# Altium schematic symbol library LATTICEPLDS_Library.SchLib: 291 symbols (part 16 of 32) (continued)
## LFE3-95EA-FN1156 (continued)
part B pins: A2 PT8B, A3 PT11B, A4 PT14A, A5 PT14B, A6 PT17B, A7 PT16B, A8 PT19A, A9 PT19B, A10 PT20A, A11 PT26A, A12 PT32A, A13 PT41A, A14 PT56A, A15 PT62A, A16 PT68A, B1 PT5A, B2 PT5B, B3 PT8A, B4 PT11A, B6 PT17A, B7 PT16A, B10 PT20B, B11 PT26B, B12 PT32B, B13 PT41B, B14 PT56B, B15 PT62B, B16 PT68B, C2 PT4B, C3 PT2A, C4 PT2B, C5 PT13B, C6 PT10B, C10 PT43B, C11 PT23A, C13 PT44A, C14 PT50A, C16 PT65A, C17 PT71A, D3 PT4A, D4 PT7B, D5 PT10A, D6 PT13A, D10 PT43A, D11 PT23B, D12 PT35A, D13 PT44B, D14 PT50B, D15 PT59A, D16 PT65B, D17 PT71B, E4 PT7A, E10 PT31B, E11 PT29A, E12 PT35B, E13 PT38A, E15 PT59B, E17 PT64A, F10 PT31A, F12 PT29B, F13 PT38B, F18 PT64B, F19 PT70B, G11 PT25A, G12 PT25B, G13 PT40A, G16 PT58A, G17 PT58B, G18 PT70A, H13 PT34B, H14 PT40B, H15 PT46B, H16 PT61B, H17 PT73B, J12 PT22A, J13 PT28B, J14 PT34A, J15 PT46A, J16 PT61A, J17 PT73A, K12 PT22B, K13 PT28A, K14 PT37A, K15 PT37B, K16 PT67A, L13 VCCIO0 (power), L16 PT67B, L17 VCCIO0 (power), M13 VCCIO0 (power), M17 VCCIO0 (power)
part C pins: A17 PT74A, A18 PT77A, A19 PT83A, A20 PT89A, A21 PT98A, A22 PT104A, A23 PT110A, A24 PT116A, A25 PT122A, A26 PT130A, A27 PT130B, A28 PT128B, A29 PT131A, A30 PT131B, A31 PT134A, B17 PT74B, B18 PT77B, B19 PT83B, B20 PT89B, B21 PT98B, B22 PT104B, B23 PT110B, B24 PT116B, B25 PT122B, B28 PT128A, B31 PT134B, C19 PT86A, C20 PT95A, C22 PT107A, C23 PT113A, C25 PT125A, C28 PT124A, C29 PT136A, C30 PT136B, D18 PT80A, D19 PT86B, D20 PT95B, D21 PT101A, D22 PT107B, D23 PT113B, D24 PT119A, D25 PT125B, D28 PT124B, E18 PT80B, E19 PT76A, E20 PT76B, E21 PT101B, E22 PT112A, E23 PT112B, E24 PT119B, F21 PT97A, F22 PT97B, G19 PT82A, G20 PT91A, G21 PT91B, G23 PT118A, G25 PT127B, G26 PT127A, H18 PT79B, H19 PT82B, H20 PT103A, H22 PT109B, H23 PT118B, H25 PT133B, H26 PT133A, J18 PT79A, J19 PT88A, J20 PT103B, J21 PT109A, J22 PT106A, J23 PT106B, K19 PT88B, K20 PT85A, K21 PT115B, K22 PT115A, K23 PT121A, K24 PT121B, L18 VCCIO1 (power), L19 PT85B, L22 VCCIO1 (power), M18 VCCIO1 (power), M22 VCCIO1 (power)
part D pins: N23 VCCIO2 (power), N24 VCCIO2 (power), N26 PR19A, N27 PR22A, N28 PR22B, N29 PR17B, N30 PR17A, N31 PR20B, N32 PR20A, N33 PR23B, N34 PR23A, P26 PR19B, P27 PR25B, P28 PR25A, P30 PR25E_C, P31 PR25E_B, P32 PR25E_A, P33 PR26B, P34 PR26A, R25 PR31B, R26 PR31A, R27 PR28B, R28 PR28A, R29 PR25E_D, R30 PR29B, R31 PR29A, R33 PR32B, R34 PR32A, T26 PR37A, T27 PR37B, T28 PR34B, T29 PR34A, T30 PR40A, T31 PR35B, T32 PR35A, T33 PR38B, T34 PR38A, U23 VCCIO2 (power), U24 VCCIO2 (power), U26 PR43A, U27 PR43B, U30 PR40B, U31 PR41B, U32 PR41A, U33 PR43E_B, U34 PR43E_A, V33 PR43E_D, V34 PR43E_C
part E pins: AA25 PR64A, AA26 PR64B, AA27 PR70B, AA28 PR70A, AA29 PR58B, AA30 PR65B, AA31 PR65A, AA33 PR61E_B, AA34 PR61E_A, AB23 VCCIO3 (power), AB24 VCCIO3 (power), AB28 PR70E_C, AB29 PR70E_D, AB30 PR67A, AB33 PR62B, AB34 PR62A, AC30 PR67B, AC31 PR70E_B, AC32 PR70E_A, AC33 PR68B, AC34 PR68A, AE26 PB145B, AE29 PR74B, AE30 PR74A, AE31 PR71B, AE32 PR71A, AF26 PB145A, AF31 PR77B, AF32 PR77A, AG26 PB136B, AH26 PB136A, AH27 PB142A, AH28 PB142B, AH33 PR82A, AJ27 PB139B, AJ28 PB140B, AJ31 PR88A, AJ33 PR82B, AJ34 PR79E_C, AK27 PB139A, AK28 PB140A, AK29 PB143B, AK31 PR88B, AK32 PR86B, AK34 PR79E_D, AL27 PB134B, AL28 PB137B, AL29 PB143A, AL30 PR91A, AL31 PR95A, AL32 PR86A, AL33 PR85B, AL34 PR85A, AM27 PB134A, AM28 PB137A, AM29 PR97A, AM30 PR91B, AM31 PR95B, AM32 PR89B, AM33 PR79E_B, AM34 PR79E_A, AN27 PB133B, AN28 PB131B, AN29 PR97B, AN31 PR92B, AN32 PR89A, AN33 PR80B, AN34 PR80A, AP27 PB133A, AP28 PB131A, AP29 PR94A, AP30 PR94B, AP31 PR92A, AP32 PR83B, AP33 PR83A, U28 PR46A, V23 VCCIO3 (power), V24 VCCIO3 (power), V26 PR49B, V27 PR49A, V28 PR46B, V29 PR52A, V30 PR44B, V31 PR44A, W26 PR55B, W27 PR55A, W28 PR52B, W29 PR53B, W30 PR53A, W31 PR50B, W32 PR50A, W33 PR47B, W34 PR47A, Y25 PR61B, Y26 PR61A, Y27 PR61E_D, Y28 PR61E_C, Y30 PR58A, Y31 PR59B, Y32 PR59A, Y33 PR56B, Y34 PR56A
part F pins: AA1 PL62B, AA2 PL62A, AA3 PL65B, AA4 PL65A, AA5 PL70A, AA7 PL64B, AA8 PL61B, AA10 PL67A, AB1 PL68B, AB2 PL68A, AB5 PL70B, AB9 PL67B, AB11 VCCIO6 (power), AB12 VCCIO6 (power), AC6 PL70E_C, AC7 PL70E_D, AD1 PL70E_B, AD2 PL70E_A, AD3 PL71B, AD4 PL71A, AD8 PL82B, AD9 PL82A, AD10 PB4B, AE1 PL74B, AE2 PL74A, AE3 PL77B, AE4 PL77A, AE9 PB4A, AF9 PB7A, AG9 PB7B, AH7 PB2A, AH9 PB13A, AJ2 PL85A, AJ3 PL85B, AJ4 PL88A, AJ5 PL91A, AJ6 PL91B, AJ7 PB2B, AJ8 PB13B, AK3 PL86B, AK4 PL88B, AK6 PB5A, AK7 PB8A, AK8 PB10A, AL1 PL79E_C, AL2 PL79E_D, AL3 PL86A, AL4 PL95A, AL5 PL92A, AL6 PB5B, AL7 PB8B, AL8 PB10B, AM1 PL79E_A, AM2 PL79E_B, AM3 PL89B, AM4 PL95B, AM5 PL92B, AM6 PL94A, AM7 PB11A, AM8 PB11B, AN1 PL80A, AN2 PL80B, AN3 PL89A, AN6 PL94B, AN7 PB14A, AN8 PB16A, AP2 PL83A, AP3 PL83B, AP5 PL97A, AP6 PL97B, AP7 PB14B, AP8 PB16B, U1 PL44B, U2 PL44A, V1 PL47B, V2 PL47A, V3 PL50B, V4 PL50A, V5 PL49A, V7 PL52A, V8 PL46B, V9 PL46A, V11 VCCIO6 (power), V12 VCCIO6 (power), W1 PL53B, W2 PL53A, W3 PL56B, W4 PL56A, W5 PL49B, W6 PL58A, W7 PL52B, W8 PL55A, W9 PL55B, Y1 PL59B, Y2 PL59A, Y4 PL61E_B, Y5 PL61E_A, Y6 PL58B, Y7 PL64A, Y8 PL61A, Y9 PL61E_C, Y10 PL61E_D
part G pins: E3 PL10B, F1 PL8B, F2 PL8A, F3 PL10A, G1 PL11B, G2 PL11A, G3 PL13A, G4 PL2A, G5 PL2B, H1 PL14A, H2 PL16B, H3 PL13B, H4 PL5B, H5 PL5A, J1 PL14B, J3 PL16A, K8 PL4B, K9 PL4A, M5 PL19A, M10 PL22A, N1 PL20B, N2 PL20A, N3 PL17B, N4 PL17A, N5 PL19B, N6 PL25E_D, N7 PL25E_C, N8 PL25A, N10 PL22B, N11 VCCIO7 (power), N12 VCCIO7 (power), P1 PL25E_B, P2 PL25E_A, P4 PL23B, P5 PL23A, P6 PL31B, P7 PL31A, P8 PL25B, P9 PL28A, P10 PL28B, R1 PL29B, R2 PL29A, R3 PL32B, R4 PL32A, R5 PL26B, R7 PL26A, R8 PL37A, R9 PL34A, R10 PL34B, T1 PL41B, T2 PL41A, T3 PL38B, T4 PL38A, T5 PL35B, T6 PL35A, T7 PL37B, T8 PL40B, T9 PL40A, U4 PL43E_B, U5 PL43E_A, U6 PL43E_C, U7 PL43E_D, U8 PL43B, U9 PL43A, U11 VCCIO7 (power), U12 VCCIO7 (power)
part H pins: A32 PT140A, A33 PT140B, B32 PT143A, B33 CFG0, B34 PROGRAMN, C31 PT145B, C32 PT143B, C33 INITN, C34 CCLK, D29 PT142B, D30 PT142A, D31 PT145A, D32 CFG2, D33 PR5A, D34 PR5B, E31 PR10A, E32 PR10B, E34 PR8A, F30 CFG1, F31 PR7B, F32 PR16A, F33 PR16B, F34 PR8B, G30 PR7A, G31 DONE, G32 PR13B, G33 PR13A, G34 PR11A, H33 PR11B, H34 PR14A, J34 PR14B, N25 VCCIO8 (power), P25 VCCIO8 (power)
part I pins: C1 TDO (out), D1 TCK (in), D2 TMS (in), E1 TDI (in), K10 VCCJ (power)
part J pins: AF18 PCSA_VCCIB3, AF19 PCSA_VCCIB2, AF20 PCSA_VCCIB1, AF21 PCSA_VCCIB0, AG18 PCSA_VCCOB3, AG19 PCSA_VCCOB2, AG20 PCSA_VCCOB1, AG21 PCSA_VCCOB0, AH19 PCSA_REFCLKP, AH20 PCSA_REFCLKN, AK18 PCSA_HDINN3, AK19 PCSA_HDINN2, AK20 PCSA_HDINN1, AK21 PCSA_HDINN0, AL18 PCSA_HDINP3, AL19 PCSA_HDINP2, AL20 PCSA_HDINP1, AL21 PCSA_HDINP0, AN18 PCSA_HDOUTN3, AN19 PCSA_HDOUTN2, AN20 PCSA_HDOUTN1, AN21 PCSA_HDOUTN0, AP18 PCSA_HDOUTP3, AP19 PCSA_HDOUTP2, AP20 PCSA_HDOUTP1, AP21 PCSA_HDOUTP0

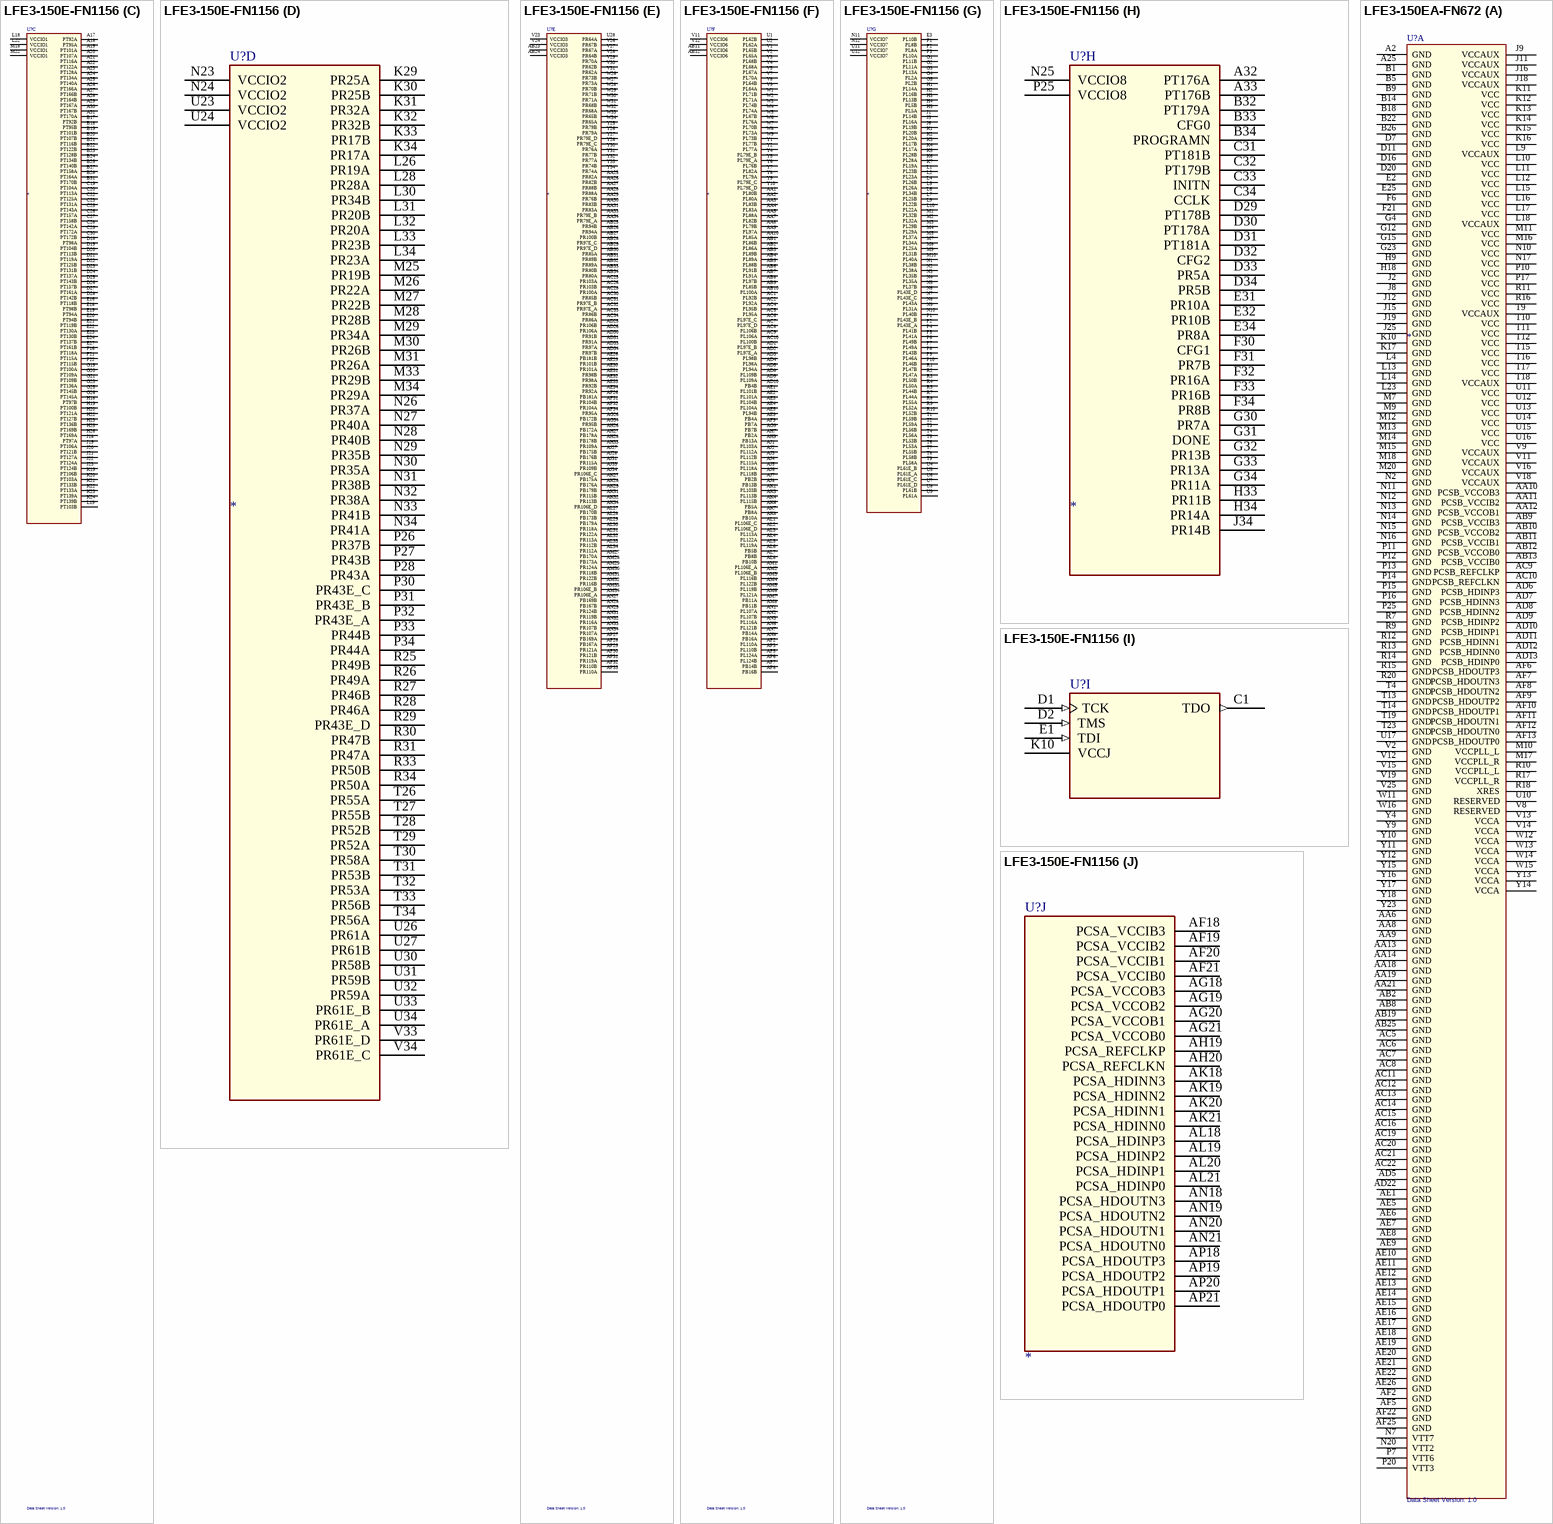
[diagram p154: symbols LFE3-150E-FN1156 to LFE3-150EA-FN672]

## LFE3-150E-FN1156
designator U?  Data Sheet Version: 1.0
SWAP_INFO: (S1+S2+S3+S4+S5+S6+S7+S8+S9+S10); SPLIT_INST: TRUE
part A pins: A1 GND (power), A34 GND (power), AA6 GND (power), AA11 GND (power), AA12 VCCAUX, AA13 VCC, AA14 GND (power), AA15 GND (power), AA16 GND (power), AA17 GND (power), AA18 GND (power), AA19 GND (power), AA20 GND (power), AA21 GND (power), AA22 VCC, AA23 VCCAUX, AA24 GND (power), AA32 GND (power), AB13 VCC, AB14 VCC, AB15 VCC, AB16 VCC, AB17 VCC, AB18 VCC, AB19 VCC, AB20 VCC, AB21 VCC, AB22 VCC, AC3 GND (power), AC11 GND (power), AC12 GND (power), AC13 VCCA, AC14 VCCAUX, AC15 VCCAUX, AC16 GND (power), AC17 VCCA, AC18 VCCA, AC19 GND (power), AC20 VCCAUX, AC21 VCCAUX, AC22 VCCA, AC23 GND (power), AC24 GND (power), AC27 NC, AC29 GND (power), AD6 GND (power), AD7 NC, AD11 GND (power), AD12 GND (power), AD13 VCCA, AD14 GND (power), AD15 GND (power), AD16 VCCA, AD17 VCCA, AD18 VCCA, AD19 VCCA, AD20 GND (power), AD21 GND (power), AD22 VCCA, AD23 GND (power), AD24 GND (power), AD27 NC, AD28 NC, AD29 NC, AD32 GND (power), AE6 NC, AE7 NC, AE8 NC, AE10 GND (power), AE11 GND (power), AE12 VCCA, AE13 VCCA, AE14 PCSD_VCCOB0, AE15 PCSD_VCCIB0, AE16 VCCA, AE17 GND (power), AE18 GND (power), AE19 VCCA, AE20 PCSC_VCCIB3, AE21 PCSC_VCCOB3, AE22 VCCA, AE23 VCCA, AE24 GND (power), AE25 GND (power), AE27 NC, AE28 NC, AF1 NC, AF2 GND (power), AF3 NC, AF4 NC, AF5 GND (power), AF6 NC, AF7 NC, AF8 NC, AF10 GND (power), AF11 PCSD_VCCIB3, AF12 PCSD_VCCIB2, AF13 PCSD_VCCIB1, AF14 PCSB_VCCIB3, AF15 PCSB_VCCIB2, AF16 PCSB_VCCIB1, AF17 PCSB_VCCIB0, AF22 PCSC_VCCIB2, AF23 PCSC_VCCIB1, AF24 PCSC_VCCIB0, AF25 GND (power), AF27 NC, AF28 NC, AF29 NC, AF30 GND (power), AF33 GND (power), AG1 NC, AG2 NC, AG3 NC, AG4 NC, AG5 NC, AG6 NC, AG7 NC, AG8 GND (power), AG10 GND (power), AG11 PCSD_VCCOB3, AG12 PCSD_VCCOB2, AG13 PCSD_VCCOB1, AG14 PCSB_VCCOB3, AG15 PCSB_VCCOB2, AG16 PCSB_VCCOB1, AG17 PCSB_VCCOB0, AG22 PCSC_VCCOB2, AG23 PCSC_VCCOB1, AG24 PCSC_VCCOB0, AG25 GND (power), AG27 GND (power), AG28 NC, AG29 NC, AG30 NC, AG31 NC, AG32 NC, AG33 NC, AH1 NC, AH2 NC, AH3 NC, AH4 NC, AH5 NC, AH6 NC, AH8 NC, AH10 GND (power), AH11 GND (power), AH12 PCSD_REFCLKP, AH13 PCSD_REFCLKN, AH14 GND (power), AH15 PCSB_REFCLKP, AH16 PCSB_REFCLKN, AH17 GND (power), AH18 GND (power), AH21 GND (power), AH22 PCSC_REFCLKP, AH23 PCSC_REFCLKN, AH24 GND (power), AH25 GND (power), AH29 NC, AH30 NC, AH31 NC, AH32 NC, AH34 NC, AJ9 GND (power), AJ10 GND (power), AJ11 GND (power), AJ12 GND (power), AJ13 GND (power), AJ14 GND (power), AJ15 GND (power), AJ16 GND (power), AJ17 GND (power), AJ18 GND (power), AJ19 GND (power), AJ20 GND (power), AJ21 GND (power), AJ22 GND (power), AJ23 GND (power), AJ24 GND (power), AJ25 GND (power), AJ26 GND (power), AJ29 NC, AJ30 NC, AJ32 NC, AK2 GND (power), AK5 GND (power), AK9 GND (power), AK10 PCSD_HDINN3, AK11 PCSD_HDINN2, AK12 PCSD_HDINN1, AK13 PCSD_HDINN0, AK14 PCSB_HDINN3, AK15 PCSB_HDINN2, AK16 PCSB_HDINN1, AK17 PCSB_HDINN0, AK22 PCSC_HDINN3, AK23 PCSC_HDINN2, AK24 PCSC_HDINN1, AK25 PCSC_HDINN0, AK26 GND (power), AK30 GND (power), AK33 GND (power), AL9 GND (power), AL10 PCSD_HDINP3, AL11 PCSD_HDINP2, AL12 PCSD_HDINP1, AL13 PCSD_HDINP0, AL14 PCSB_HDINP3, AL15 PCSB_HDINP2, AL16 PCSB_HDINP1, AL17 PCSB_HDINP0, AL22 PCSC_HDINP3, AL23 PCSC_HDINP2, AL24 PCSC_HDINP1, AL25 PCSC_HDINP0, AL26 GND (power), AM9 GND (power), AM10 GND (power), AM11 GND (power), AM12 GND (power), AM13 GND (power), AM14 GND (power), AM15 GND (power), AM16 GND (power), AM17 GND (power), AM18 GND (power), AM19 GND (power), AM20 GND (power), AM21 GND (power), AM22 GND (power), AM23 GND (power), AM24 GND (power), AM25 GND (power), AM26 GND (power), AN4 RESERVED, AN5 GND (power), AN9 GND (power), AN10 PCSD_HDOUTN3, AN11 PCSD_HDOUTN2, AN12 PCSD_HDOUTN1, AN13 PCSD_HDOUTN0, AN14 PCSB_HDOUTN3, AN15 PCSB_HDOUTN2, AN16 PCSB_HDOUTN1, AN17 PCSB_HDOUTN0, AN22 PCSC_HDOUTN3, AN23 PCSC_HDOUTN2, AN24 PCSC_HDOUTN1, AN25 PCSC_HDOUTN0, AN26 GND (power), AN30 GND (power), AP1 GND (power), AP4 RESERVED, AP9 GND (power), AP10 PCSD_HDOUTP3, AP11 PCSD_HDOUTP2, AP12 PCSD_HDOUTP1, AP13 PCSD_HDOUTP0, AP14 PCSB_HDOUTP3, AP15 PCSB_HDOUTP2, AP16 PCSB_HDOUTP1, AP17 PCSB_HDOUTP0, AP22 PCSC_HDOUTP3, AP23 PCSC_HDOUTP2, AP24 PCSC_HDOUTP1, AP25 PCSC_HDOUTP0, AP26 GND (power), AP34 GND (power), B5 GND (power), B9 GND (power), B26 GND (power), B29 NC, B30 GND (power), C7 NC, C12 GND (power), C15 GND (power), C18 GND (power), C21 GND (power), C24 GND (power), D7 NC, D8 NC, E2 GND (power), E5 GND (power), E6 NC, E7 NC, E8 NC, E9 GND (power), E14 NC, E25 NC, E26 GND (power), E28 NC, E29 NC, E30 GND (power), E33 GND (power), F4 NC, F5 NC, F6 NC, F7 NC, F8 NC, F9 NC, F11 GND (power), F14 GND (power), F15 NC, F17 GND (power), F20 GND (power), F23 GND (power), F24 NC, F25 NC, F26 NC, F27 NC, F28 NC, F29 NC, G6 NC, G7 NC, G8 NC, G9 NC, G10 NC, G14 NC, G15 NC, G22 NC, G24 NC, G27 NC, G28 NC, G29 NC, H6 NC, H7 NC, H8 GND (power), H9 NC, H10 NC, H21 NC, H24 NC, H27 GND (power), H28 NC, H29 NC, H30 NC, H31 NC, H32 NC, J2 GND (power), J4 NC, J5 GND (power), J7 NC, J8 NC, J9 NC, J10 NC, J24 NC, J25 NC, J26 NC, J27 NC, J28 NC, J29 NC, J30 GND (power), J31 NC, J32 NC, J33 GND (power), K8 NC, K9 NC, K17 GND (power), K18 GND (power), K25 NC, K26 NC, K27 NC, K28 NC, L3 GND (power), L8 NC, L11 GND (power), L12 GND (power), L14 GND (power), L15 GND (power), L20 GND (power), L21 GND (power), L23 GND (power), L24 GND (power), L25 NC, L27 NC, L29 GND (power), M6 GND (power), M11 GND (power), M12 GND (power), M14 VCCAUX, M15 VCCAUX, M16 GND (power), M19 GND (power), M20 VCCAUX, M21 VCCAUX, M23 GND (power), M24 GND (power), M32 GND (power), N13 VCC, N14 VCC, N15 VCC, N16 VCC, N17 VCC, N18 VCC, N19 VCC, N20 VCC, N21 VCC, N22 VCC, P3 GND (power), P11 GND (power), P12 VCCAUX, P13 VCC, P14 GND (power), P15 GND (power), P16 GND (power), P17 GND (power), P18 GND (power), P19 GND (power), P20 GND (power), P21 GND (power), P22 VCC, P23 VCCAUX, P24 GND (power), P29 GND (power), R6 GND (power), R11 GND (power), R12 VCCAUX, R13 VCC, R14 GND (power), R15 GND (power), R16 GND (power), R17 GND (power), R18 GND (power), R19 GND (power), R20 GND (power), R21 GND (power), R22 VCC, R23 VCCAUX, R24 GND (power), R32 GND (power), T10 VTT7 (power), T11 VTT7 (power), T12 GND (power), T13 VCCPLL_L, T14 GND (power), T15 GND (power), T16 GND (power), T17 GND (power), T18 GND (power), T19 GND (power), T20 GND (power), T21 GND (power), T22 VCCPLL_R, T23 GND (power), T24 VTT2 (power), T25 VTT2 (power), U3 GND (power), U10 GND (power), U13 VCC, U14 GND (power), U15 GND (power), U16 GND (power), U17 GND (power), U18 GND (power), U19 GND (power), U20 GND (power), U21 GND (power), U22 VCC, U25 GND (power), U29 GND (power), V6 GND (power), V10 GND (power), V13 VCC, V14 GND (power), V15 GND (power), V16 GND (power), V17 GND (power), V18 GND (power), V19 GND (power), V20 GND (power), V21 GND (power), V22 VCC, V25 GND (power), V32 GND (power), W10 VTT6 (power), W11 VTT6 (power), W12 GND (power), W13 VCCPLL_L, W14 GND (power), W15 GND (power), W16 GND (power), W17 GND (power), W18 GND (power), W19 GND (power), W20 GND (power), W21 GND (power), W22 VCCPLL_R, W23 XRES, W24 VTT3 (power), W25 VTT3 (power), Y3 GND (power), Y11 GND (power), Y12 VCCAUX, Y13 VCC, Y14 GND (power), Y15 GND (power), Y16 GND (power), Y17 GND (power), Y18 GND (power), Y19 GND (power), Y20 GND (power), Y21 GND (power), Y22 VCC, Y23 VCCAUX, Y24 GND (power), Y29 GND (power)
part B pins: A2 PT8B, A3 PT11B, A4 PT14A, A5 PT14B, A6 PT17B, A7 PT16B, A8 PT19A, A9 PT19B, A10 PT38A, A11 PT44A, A12 PT50A, A13 PT59A, A14 PT74A, A15 PT80A, A16 PT86A, B1 PT5A, B2 PT5B, B3 PT8A, B4 PT11A, B6 PT17A, B7 PT16A, B8 PT20A, B10 PT38B, B11 PT44B, B12 PT50B, B13 PT59B, B14 PT74B, B15 PT80B, B16 PT86B, C2 PT4B, C3 PT2A, C4 PT2B, C5 PT13B, C6 PT10B, C8 PT20B, C9 PT26B, C10 PT61B, C11 PT41A, C13 PT62A, C14 PT68A, C16 PT83A, C17 PT89A, D3 PT4A, D4 PT7B, D5 PT10A, D6 PT13A, D9 PT26A, D10 PT61A, D11 PT41B, D12 PT53A, D13 PT62B, D14 PT68B, D15 PT77A, D16 PT83B, D17 PT89B, E4 PT7A, E10 PT49B, E11 PT47A, E12 PT53B, E13 PT56A, E15 PT77B, E17 PT82A, F10 PT49A, F12 PT47B, F13 PT56B, F18 PT82B, F19 PT88B, G11 PT43A, G12 PT43B, G13 PT58A, G16 PT76A, G17 PT76B, G18 PT88A, H11 PT28A, H12 PT28B, H13 PT52B, H14 PT58B, H15 PT64B, H16 PT79B, H17 PT91B, J11 PT22B, J12 PT40A, J13 PT46B, J14 PT52A, J15 PT64A, J16 PT79A, J17 PT91A, K11 PT22A, K12 PT40B, K13 PT46A, K14 PT55A, K15 PT55B, K16 PT85A, L13 VCCIO0 (power), L16 PT85B, L17 VCCIO0 (power), M13 VCCIO0 (power), M17 VCCIO0 (power)
part C pins: A17 PT92A, A18 PT95A, A19 PT101A, A20 PT107A, A21 PT116A, A22 PT122A, A23 PT128A, A24 PT134A, A25 PT140A, A26 PT166A, A27 PT166B, A28 PT164B, A29 PT167A, A30 PT167B, A31 PT170A, B17 PT92B, B18 PT95B, B19 PT101B, B20 PT107B, B21 PT116B, B22 PT122B, B23 PT128B, B24 PT134B, B25 PT140B, B27 PT158A, B28 PT164A, B31 PT170B, C19 PT104A, C20 PT113A, C22 PT125A, C23 PT131A, C25 PT143A, C26 PT157A, C27 PT158B, C28 PT142A, C29 PT172A, C30 PT172B, D18 PT98A, D19 PT104B, D20 PT113B, D21 PT119A, D22 PT125B, D23 PT131B, D24 PT137A, D25 PT143B, D26 PT157B, D27 PT161A, D28 PT142B, E16 PT118B, E18 PT98B, E19 PT94A, E20 PT94B, E21 PT119B, E22 PT130A, E23 PT130B, E24 PT137B, E27 PT161B, F16 PT118A, F21 PT115A, F22 PT115B, G19 PT100A, G20 PT109A, G21 PT109B, G23 PT136A, G25 PT145B, G26 PT145A, H18 PT97B, H19 PT100B, H20 PT121A, H22 PT127B, H23 PT136B, H25 PT169B, H26 PT169A, J18 PT97A, J19 PT106A, J20 PT121B, J21 PT127A, J22 PT124A, J23 PT124B, K19 PT106B, K20 PT103A, K21 PT133B, K22 PT133A, K23 PT139A, K24 PT139B, L18 VCCIO1 (power), L19 PT103B, L22 VCCIO1 (power), M18 VCCIO1 (power), M22 VCCIO1 (power)
part D pins: K29 PR25A, K30 PR25B, K31 PR32A, K32 PR32B, K33 PR17B, K34 PR17A, L26 PR19A, L28 PR28A, L30 PR34B, L31 PR20B, L32 PR20A, L33 PR23B, L34 PR23A, M25 PR19B, M26 PR22A, M27 PR22B, M28 PR28B, M29 PR34A, M30 PR26B, M31 PR26A, M33 PR29B, M34 PR29A, N23 VCCIO2 (power), N24 VCCIO2 (power), N26 PR37A, N27 PR40A, N28 PR40B, N29 PR35B, N30 PR35A, N31 PR38B, N32 PR38A, N33 PR41B, N34 PR41A, P26 PR37B, P27 PR43B, P28 PR43A, P30 PR43E_C, P31 PR43E_B, P32 PR43E_A, P33 PR44B, P34 PR44A, R25 PR49B, R26 PR49A, R27 PR46B, R28 PR46A, R29 PR43E_D, R30 PR47B, R31 PR47A, R33 PR50B, R34 PR50A, T26 PR55A, T27 PR55B, T28 PR52B, T29 PR52A, T30 PR58A, T31 PR53B, T32 PR53A, T33 PR56B, T34 PR56A, U23 VCCIO2 (power), U24 VCCIO2 (power), U26 PR61A, U27 PR61B, U30 PR58B, U31 PR59B, U32 PR59A, U33 PR61E_B, U34 PR61E_A, V33 PR61E_D, V34 PR61E_C
part E pins: AA25 PR82A, AA26 PR82B, AA27 PR88B, AA28 PR88A, AA29 PR76B, AA30 PR83B, AA31 PR83A, AA33 PR79E_B, AA34 PR79E_A, AB23 VCCIO3 (power), AB24 VCCIO3 (power), AB25 PR94B, AB26 PR94A, AB27 PR100B, AB28 PR97E_C, AB29 PR97E_D, AB30 PR85A, AB31 PR89B, AB32 PR89A, AB33 PR80B, AB34 PR80A, AC25 PR103A, AC26 PR103B, AC28 PR100A, AC30 PR85B, AC31 PR97E_B, AC32 PR97E_A, AC33 PR86B, AC34 PR86A, AD25 PR106B, AD26 PR106A, AD30 PR91B, AD31 PR91A, AD33 PR97A, AD34 PR97B, AE26 PB181B, AE29 PR101B, AE30 PR101A, AE31 PR98B, AE32 PR98A, AE33 PR92B, AE34 PR92A, AF26 PB181A, AF31 PR104B, AF32 PR104A, AF34 PR95A, AG26 PB172B, AG34 PR95B, AH26 PB172A, AH27 PB178A, AH28 PB178B, AH33 PR109A, AJ27 PB175B, AJ28 PB176B, AJ31 PR115A, AJ33 PR109B, AJ34 PR106E_C, AK27 PB175A, AK28 PB176A, AK29 PB179B, AK31 PR115B, AK32 PR113B, AK34 PR106E_D, AL27 PB170B, AL28 PB173B, AL29 PB179A, AL30 PR118A, AL31 PR122A, AL32 PR113A, AL33 PR112B, AL34 PR112A, AM27 PB170A, AM28 PB173A, AM29 PR124A, AM30 PR118B, AM31 PR122B, AM32 PR116B, AM33 PR106E_B, AM34 PR106E_A, AN27 PB169B, AN28 PB167B, AN29 PR124B, AN31 PR119B, AN32 PR116A, AN33 PR107B, AN34 PR107A, AP27 PB169A, AP28 PB167A, AP29 PR121A, AP30 PR121B, AP31 PR119A, AP32 PR110B, AP33 PR110A, U28 PR64A, V23 VCCIO3 (power), V24 VCCIO3 (power), V26 PR67B, V27 PR67A, V28 PR64B, V29 PR70A, V30 PR62B, V31 PR62A, W26 PR73B, W27 PR73A, W28 PR70B, W29 PR71B, W30 PR71A, W31 PR68B, W32 PR68A, W33 PR65B, W34 PR65A, Y25 PR79B, Y26 PR79A, Y27 PR79E_D, Y28 PR79E_C, Y30 PR76A, Y31 PR77B, Y32 PR77A, Y33 PR74B, Y34 PR74A
part F pins: AA1 PL80B, AA2 PL80A, AA3 PL83B, AA4 PL83A, AA5 PL88A, AA7 PL82B, AA8 PL79B, AA9 PL97A, AA10 PL85A, AB1 PL86B, AB2 PL86A, AB3 PL89B, AB4 PL89A, AB5 PL88B, AB6 PL91B, AB7 PL91A, AB8 PL97B, AB9 PL85B, AB10 PL100A, AB11 VCCIO6 (power), AB12 VCCIO6 (power), AC1 PL92B, AC2 PL92A, AC4 PL95B, AC5 PL95A, AC6 PL97E_C, AC7 PL97E_D, AC8 PL106B, AC9 PL106A, AC10 PL100B, AD1 PL97E_B, AD2 PL97E_A, AD3 PL98B, AD4 PL98A, AD5 PL94A, AD8 PL109B, AD9 PL109A, AD10 PB4B, AE1 PL101B, AE2 PL101A, AE3 PL104B, AE4 PL104A, AE5 PL94B, AE9 PB4A, AF9 PB7A, AG9 PB7B, AH7 PB2A, AH9 PB13A, AJ1 PL103A, AJ2 PL112A, AJ3 PL112B, AJ4 PL115A, AJ5 PL118A, AJ6 PL118B, AJ7 PB2B, AJ8 PB13B, AK1 PL103B, AK3 PL113B, AK4 PL115B, AK6 PB5A, AK7 PB8A, AK8 PB10A, AL1 PL106E_C, AL2 PL106E_D, AL3 PL113A, AL4 PL122A, AL5 PL119A, AL6 PB5B, AL7 PB8B, AL8 PB10B, AM1 PL106E_A, AM2 PL106E_B, AM3 PL116B, AM4 PL122B, AM5 PL119B, AM6 PL121A, AM7 PB11A, AM8 PB11B, AN1 PL107A, AN2 PL107B, AN3 PL116A, AN6 PL121B, AN7 PB14A, AN8 PB16A, AP2 PL110A, AP3 PL110B, AP5 PL124A, AP6 PL124B, AP7 PB14B, AP8 PB16B, U1 PL62B, U2 PL62A, V1 PL65B, V2 PL65A, V3 PL68B, V4 PL68A, V5 PL67A, V7 PL70A, V8 PL64B, V9 PL64A, V11 VCCIO6 (power), V12 VCCIO6 (power), W1 PL71B, W2 PL71A, W3 PL74B, W4 PL74A, W5 PL67B, W6 PL76A, W7 PL70B, W8 PL73A, W9 PL73B, Y1 PL77B, Y2 PL77A, Y4 PL79E_B, Y5 PL79E_A, Y6 PL76B, Y7 PL82A, Y8 PL79A, Y9 PL79E_C, Y10 PL79E_D
part G pins: E3 PL10B, F1 PL8B, F2 PL8A, F3 PL10A, G1 PL11B, G2 PL11A, G3 PL13A, G4 PL2A, G5 PL2B, H1 PL14A, H2 PL16B, H3 PL13B, H4 PL5B, H5 PL5A, J1 PL14B, J3 PL16A, J6 PL19B, K1 PL20B, K2 PL20A, K3 PL17B, K4 PL17A, K5 PL28B, K6 PL28A, K7 PL19A, L1 PL23B, L2 PL23A, L4 PL26B, L5 PL26A, L6 PL34B, L7 PL25B, L9 PL22B, L10 PL22A, M1 PL32B, M2 PL32A, M3 PL29B, M4 PL29A, M5 PL37A, M7 PL34A, M8 PL25A, M9 PL31B, M10 PL40A, N1 PL38B, N2 PL38A, N3 PL35B, N4 PL35A, N5 PL37B, N6 PL43E_D, N7 PL43E_C, N8 PL43A, N9 PL31A, N10 PL40B, N11 VCCIO7 (power), N12 VCCIO7 (power), P1 PL43E_B, P2 PL43E_A, P4 PL41B, P5 PL41A, P6 PL49B, P7 PL49A, P8 PL43B, P9 PL46A, P10 PL46B, R1 PL47B, R2 PL47A, R3 PL50B, R4 PL50A, R5 PL44B, R7 PL44A, R8 PL55A, R9 PL52A, R10 PL52B, T1 PL59B, T2 PL59A, T3 PL56B, T4 PL56A, T5 PL53B, T6 PL53A, T7 PL55B, T8 PL58B, T9 PL58A, U4 PL61E_B, U5 PL61E_A, U6 PL61E_C, U7 PL61E_D, U8 PL61B, U9 PL61A, U11 VCCIO7 (power), U12 VCCIO7 (power)
part H pins: A32 PT176A, A33 PT176B, B32 PT179A, B33 CFG0, B34 PROGRAMN, C31 PT181B, C32 PT179B, C33 INITN, C34 CCLK, D29 PT178B, D30 PT178A, D31 PT181A, D32 CFG2, D33 PR5A, D34 PR5B, E31 PR10A, E32 PR10B, E34 PR8A, F30 CFG1, F31 PR7B, F32 PR16A, F33 PR16B, F34 PR8B, G30 PR7A, G31 DONE, G32 PR13B, G33 PR13A, G34 PR11A, H33 PR11B, H34 PR14A, J34 PR14B, N25 VCCIO8 (power), P25 VCCIO8 (power)
part I pins: C1 TDO (out), D1 TCK (in), D2 TMS (in), E1 TDI (in), K10 VCCJ (power)
part J pins: AF18 PCSA_VCCIB3, AF19 PCSA_VCCIB2, AF20 PCSA_VCCIB1, AF21 PCSA_VCCIB0, AG18 PCSA_VCCOB3, AG19 PCSA_VCCOB2, AG20 PCSA_VCCOB1, AG21 PCSA_VCCOB0, AH19 PCSA_REFCLKP, AH20 PCSA_REFCLKN, AK18 PCSA_HDINN3, AK19 PCSA_HDINN2, AK20 PCSA_HDINN1, AK21 PCSA_HDINN0, AL18 PCSA_HDINP3, AL19 PCSA_HDINP2, AL20 PCSA_HDINP1, AL21 PCSA_HDINP0, AN18 PCSA_HDOUTN3, AN19 PCSA_HDOUTN2, AN20 PCSA_HDOUTN1, AN21 PCSA_HDOUTN0, AP18 PCSA_HDOUTP3, AP19 PCSA_HDOUTP2, AP20 PCSA_HDOUTP1, AP21 PCSA_HDOUTP0

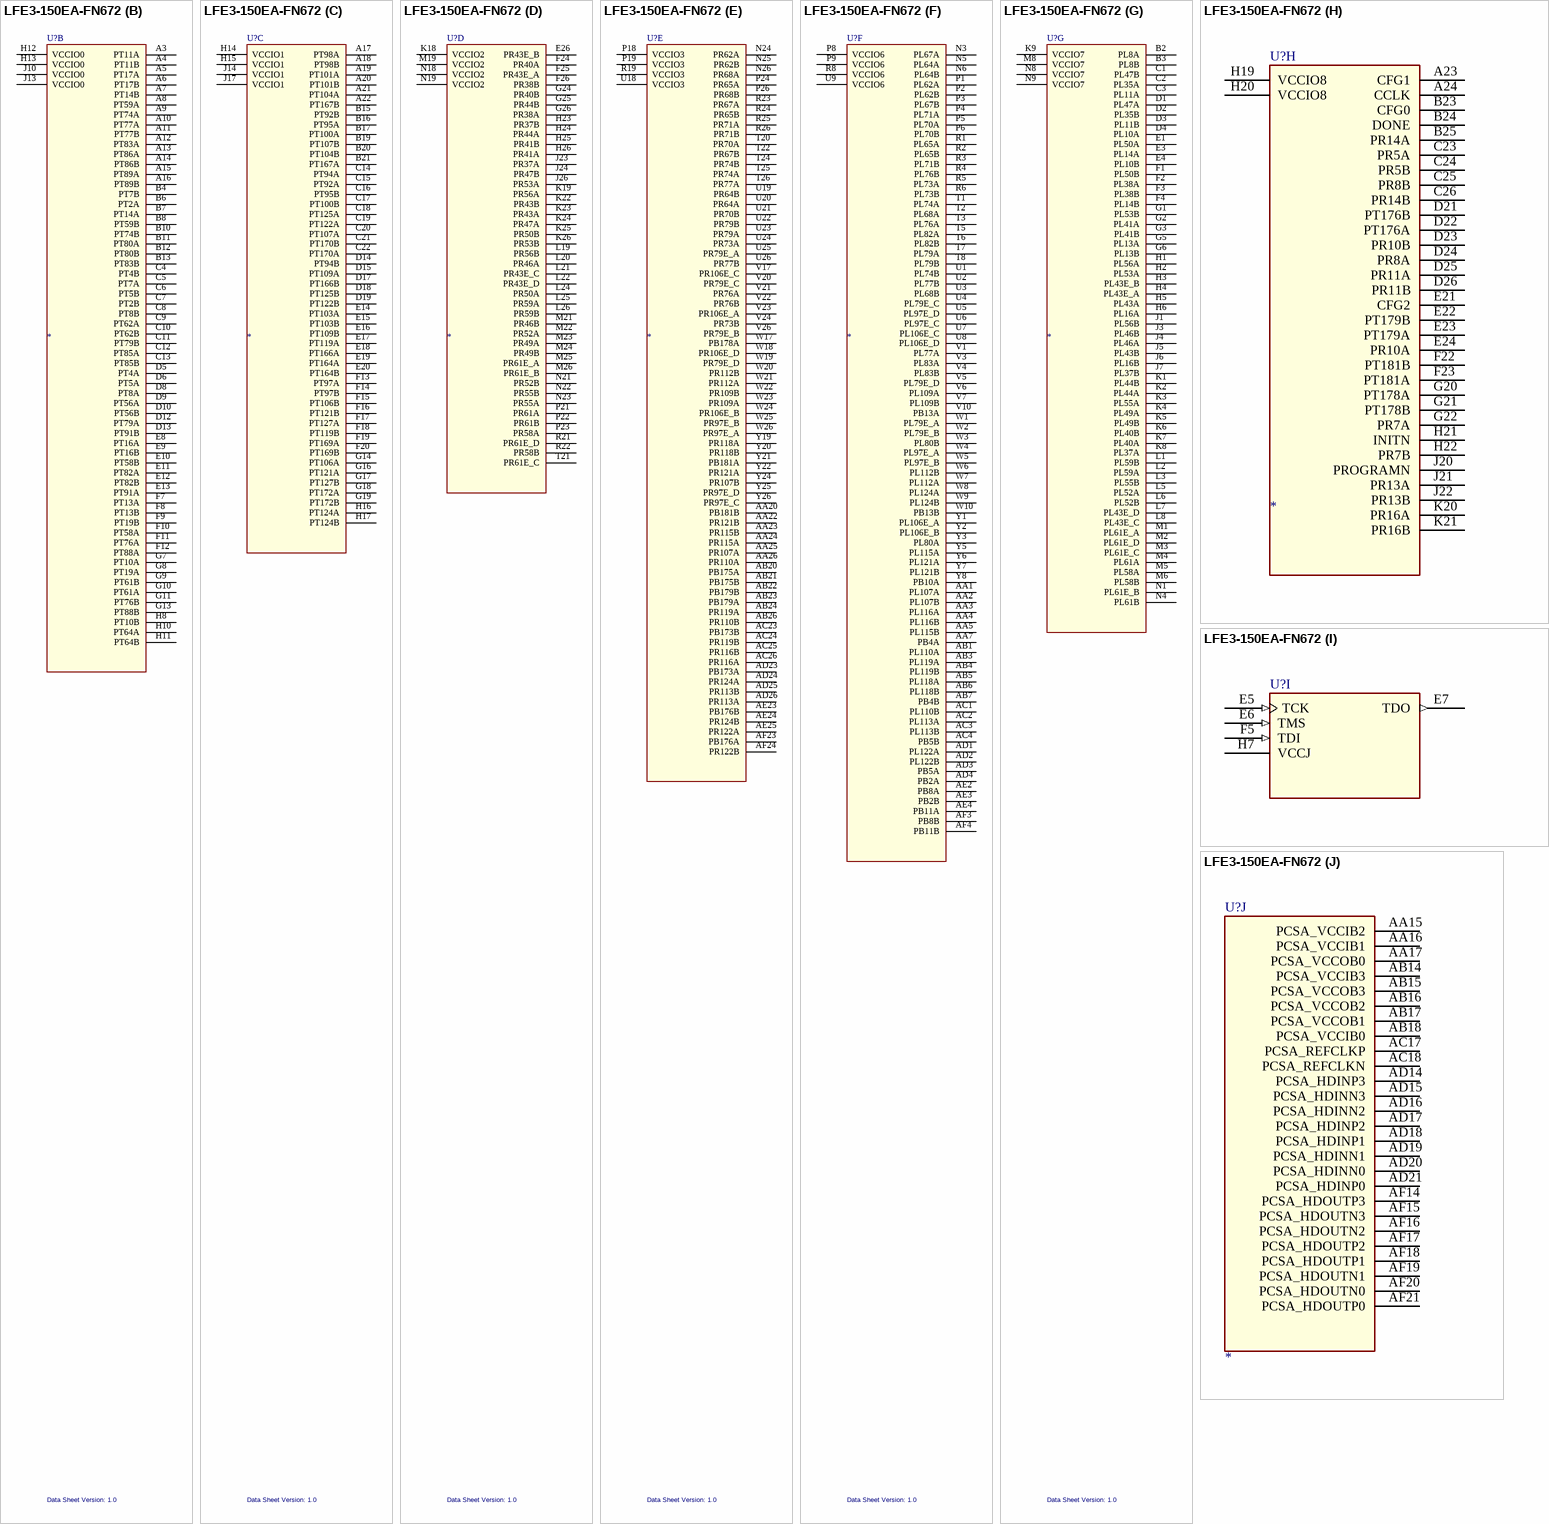
[diagram p155: symbol LFE3-150EA-FN672]